# Altium footprint library PCB Modules.PcbLib: 23 footprints (part 1 of 2)
Each footprint in its own frame and in the unit in brackets; x right, y up, seen from the top. Pads: shape width x height; smd on the part's side, far side on the other; paste and mask are expansions set on the pad; w line width, h text height; cw(c..) or ccw(c..) is an arc to the next point about the centre after c.
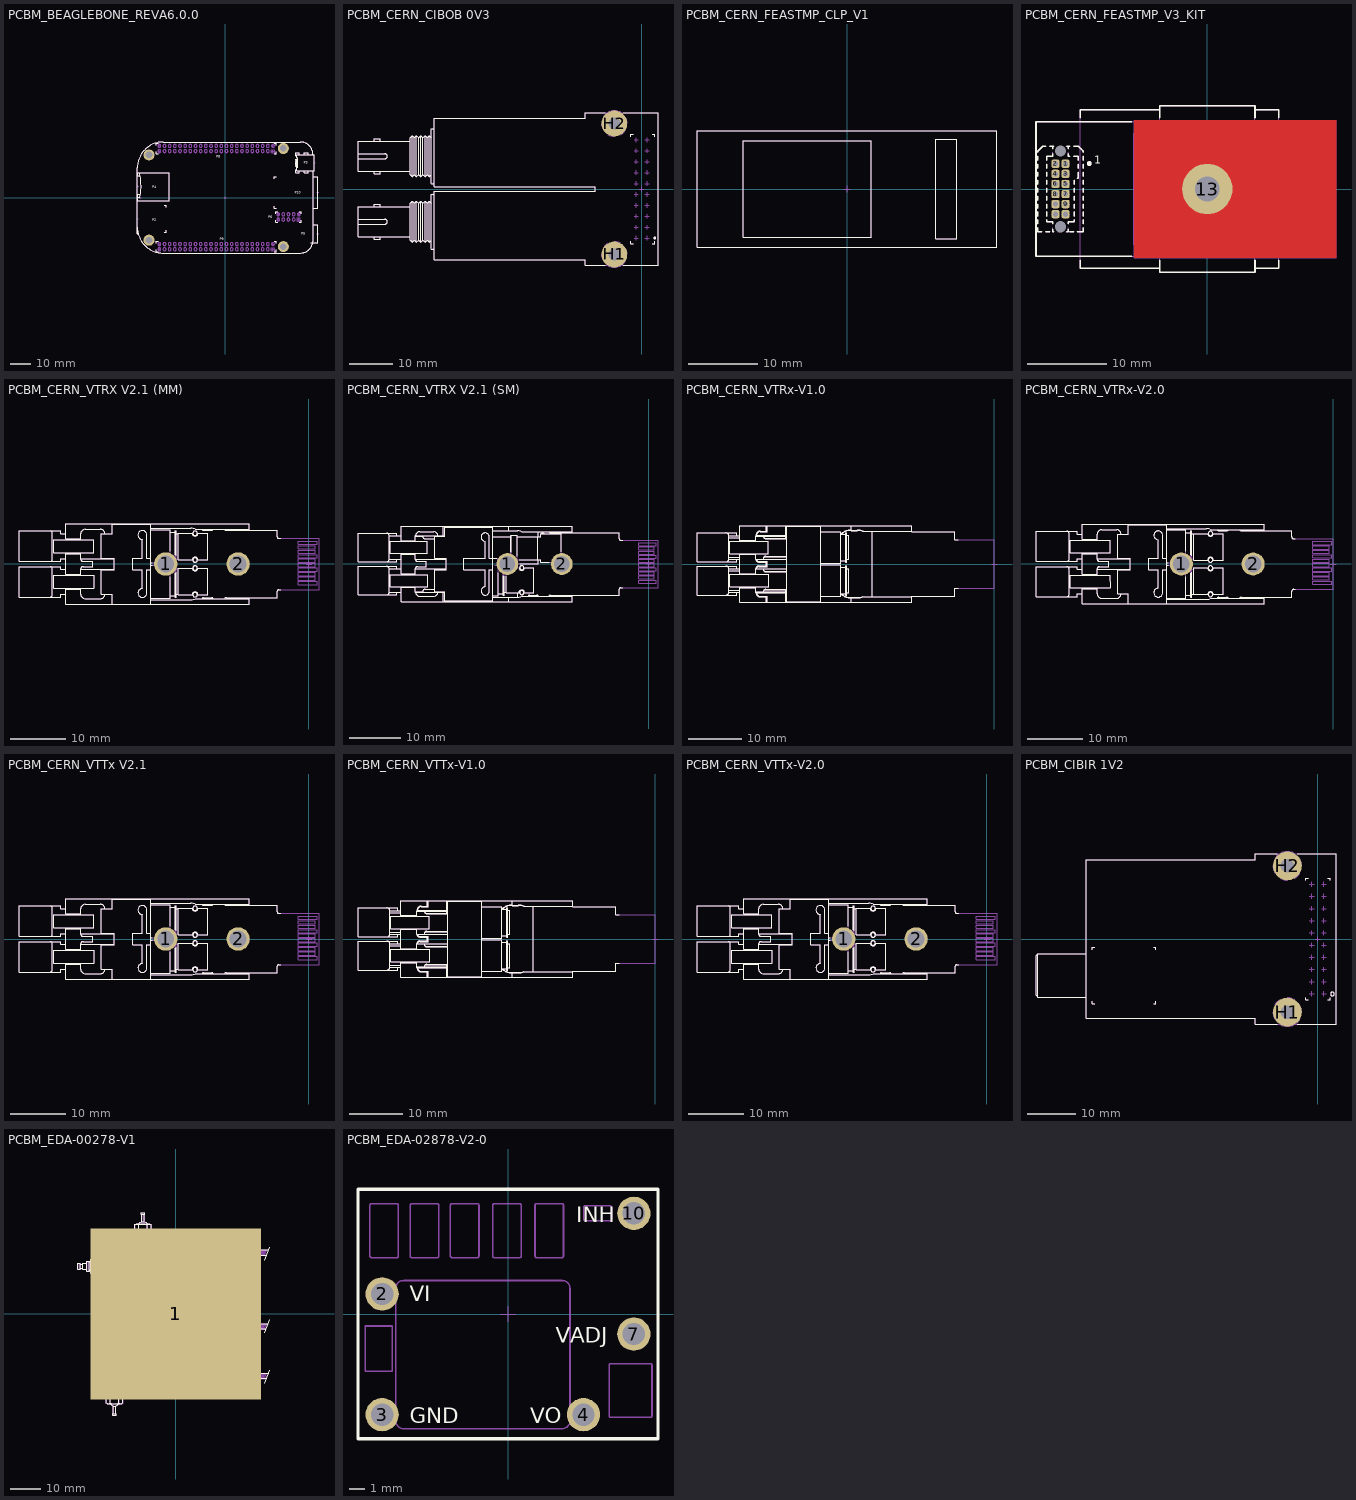
[diagram p0: the footprints below, top view; thin cyan lines are the x and y axes]

## PCBM_BEAGLEBONE_REVA6.0.0 [mm] "Beaglebone Development Module"
height 18.65
pads (4):
  round 5.4 hole 3.2: MEC1(-37.465,20.955) MEC2(-37.465,-20.955) MEC3(28.575,-24.13) MEC4(28.575,24.13)
Top Overlay:
  lines w0.2: -43.18,-3.22 -43.24,-3.22 -43.24,-17.72 -42.92,-17.72 -42.92,-17.16 ; -42.882,0.125 -41.99,0.125 ccw(c-41.99,0.225) -41.892,0.207 ccw(c-71.382,5.715) -41.932,11.433 -41.932,12.115 ; -41.812,10.775 -42.932,10.775 -42.932,12.115 -27.432,12.115 -27.432,-1.683 -42.932,-1.683 -42.932,1.675 -41.682,1.675 ; -33.905,-25.67 -33.905,-26.67 -32.905,-26.67 ; -33.905,-22.59 -33.905,-21.59 -32.905,-21.59 ; -33.905,22.59 -33.905,21.59 -32.905,21.59 ; -33.905,25.67 -33.905,26.67 -32.905,26.67 ; -30.08,-17.07 -29.08,-17.07 -29.08,-16.07 ; -30.08,-3.87 -29.08,-3.87 -29.08,-4.87 ; 24.015,-26.67 25.015,-26.67 25.015,-25.67 ; 24.015,-21.59 25.015,-21.59 25.015,-22.59 ; 24.015,21.59 25.015,21.59 25.015,22.59 ; 24.015,26.67 25.015,26.67 25.015,25.67 ; 24.175,-4.2 24.175,-5.2 25.175,-5.2 ; 24.175,9.28 24.175,10.28 25.175,10.28 ; 24.762,-11.065 24.762,-12.065 25.762,-12.065 ; 24.762,-7.985 24.762,-6.985 25.762,-6.985 ; 34.785,13.694 35.085,13.695 ; 34.785,13.695 34.785,12.195 36.285,12.195 36.285,13.295 ; 35.085,20.595 34.785,20.595 34.785,22.095 36.285,22.095 36.285,20.995 ; 35.785,15.37 34.785,15.37 34.785,15.72 35.785,15.72 ; 35.785,16.17 34.785,16.17 34.785,16.52 35.785,16.52 ; 35.785,16.97 34.785,16.97 34.785,17.32 35.785,17.32 ; 35.785,17.77 34.785,17.77 34.785,18.12 35.785,18.12 ; 35.785,18.57 34.785,18.57 34.785,18.92 35.785,18.92 ; 36.462,-12.065 37.462,-12.065 37.462,-11.065 ; 36.462,-6.985 37.462,-6.985 37.462,-7.985 ; 38.785,13.295 38.785,12.195 40.785,12.195 40.785,13.295 ; 38.785,20.995 38.785,22.095 40.785,22.095 40.785,20.995 ; 42.054,-22.28 45.554,-22.28 45.554,-13.28 43.18,-13.28 ; 43.174,20.955 ccw(c36.835,20.966) 36.836,27.305 -30.48,27.305 ccw(c-30.48,14.605) -43.18,14.605 -43.18,-14.605 ccw(c-30.48,-14.605) -30.48,-27.305 36.83,-27.305 ccw(c36.83,-20.955) 43.18,-20.955 43.18,13.295 ; 43.178,-5.2 45.515,-5.2 ; 43.18,10.28 45.515,10.28 ; 45.615,-5.1 45.615,10.18 ; 35.085,13.295 35.085,14.82 35.785,14.82 35.785,19.47 35.085,19.47 35.085,20.995 43.785,20.995 43.785,13.295 35.085,13.295
  text "P6" at 21.141,-10.071 h1.2
  text "P9" at -2.609,-20.996 h1.2
  text "P8" at -4.484,19.579 h1.2
  text "P4" at -35.963,4.663 h1.2
  text "P3" at 38.641,16.604 h1.2
  text "P2" at -35.784,-11.746 h1.2
  text "P10" at 34.166,1.929 h1.2
  text "P5" at 37.266,-18.196 h1.2
Mechanical 8:
  lines w0.1: -43.74,-10.47 -43.24,-10.47 ; -43.432,5.465 -42.932,5.465 ; -43.24,-10.97 -43.24,-10.47 ; -43.24,-9.97 -43.24,-10.47 ; -42.932,4.965 -42.932,5.465 ; -42.932,5.965 -42.932,5.465 ; -42.74,-10.47 -43.24,-10.47 ; -42.432,5.465 -42.932,5.465 ; -42.193,0 -41.693,0 ; -41.693,-0.5 -41.693,0 ; -41.693,0.5 -41.693,0 ; -41.193,0 -41.693,0 ; -37.965,-20.955 -37.465,-20.955 ; -37.965,20.955 -37.465,20.955 ; -37.465,-21.455 -37.465,-20.955 ; -37.465,-20.455 -37.465,-20.955 ; -37.465,20.455 -37.465,20.955 ; -37.465,21.455 -37.465,20.955 ; -36.965,-20.955 -37.465,-20.955 ; -36.965,20.955 -37.465,20.955 ; -32.885,-25.4 -32.385,-25.4 ; -32.885,-22.86 -32.385,-22.86 ; -32.885,22.86 -32.385,22.86 ; -32.885,25.4 -32.385,25.4 ; -32.385,-25.9 -32.385,-25.4 ; -32.385,-24.9 -32.385,-25.4 ; -32.385,-23.36 -32.385,-22.86 ; -32.385,-22.36 -32.385,-22.86 ; -32.385,22.36 -32.385,22.86 ; -32.385,23.36 -32.385,22.86 ; -32.385,24.9 -32.385,25.4 ; -32.385,25.9 -32.385,25.4 ; -31.885,-25.4 -32.385,-25.4 ; -31.885,-22.86 -32.385,-22.86 ; -31.885,22.86 -32.385,22.86 ; -31.885,25.4 -32.385,25.4 ; -0.5,0 0,0 ; 0,-0.5 0,0 ; 0,0.5 0,0 ; 0.5,0 0,0 ; 22.995,-25.4 23.495,-25.4 ; 22.995,-22.86 23.495,-22.86 ; 22.995,22.86 23.495,22.86 ; 22.995,25.4 23.495,25.4 ; 23.495,-25.9 23.495,-25.4 ; 23.495,-24.9 23.495,-25.4 ; 23.495,-23.36 23.495,-22.86 ; 23.495,-22.36 23.495,-22.86 ; 23.495,22.36 23.495,22.86 ; 23.495,23.36 23.495,22.86 ; 23.495,24.9 23.495,25.4 ; 23.495,25.9 23.495,25.4 ; 23.995,-25.4 23.495,-25.4 ; 23.995,-22.86 23.495,-22.86 ; 23.995,22.86 23.495,22.86 ; 23.995,25.4 23.495,25.4 ; 25.532,-10.795 26.032,-10.795 ; 25.532,-8.255 26.032,-8.255 ; 26.032,-11.295 26.032,-10.795 ; 26.032,-10.295 26.032,-10.795 ; 26.032,-8.755 26.032,-8.255 ; 26.032,-7.755 26.032,-8.255 ; 26.532,-10.795 26.032,-10.795 ; 26.532,-8.255 26.032,-8.255 ; 28.075,-24.13 28.575,-24.13 ; 28.075,24.13 28.575,24.13 ; 28.575,-24.63 28.575,-24.13 ; 28.575,-23.63 28.575,-24.13 ; 28.575,23.63 28.575,24.13 ; 28.575,24.63 28.575,24.13 ; 29.075,-24.13 28.575,-24.13 ; 29.075,24.13 28.575,24.13 ; 35.692,-10.795 36.192,-10.795 ; 35.692,-8.255 36.192,-8.255 ; 36.192,-11.295 36.192,-10.795 ; 36.192,-10.295 36.192,-10.795 ; 36.192,-8.755 36.192,-8.255 ; 36.192,-7.755 36.192,-8.255 ; 36.692,-10.795 36.192,-10.795 ; 36.692,-8.255 36.192,-8.255 ; 43.285,17.145 43.785,17.145 ; 43.785,16.645 43.785,17.145 ; 43.785,17.645 43.785,17.145 ; 44.285,17.145 43.785,17.145 ; 45.054,-17.78 45.554,-17.78 ; 45.115,2.54 45.615,2.54 ; 45.554,-18.28 45.554,-17.78 ; 45.554,-17.28 45.554,-17.78 ; 45.615,2.04 45.615,2.54 ; 45.615,3.04 45.615,2.54 ; 46.054,-17.78 45.554,-17.78 ; 46.115,2.54 45.615,2.54
Mechanical 14:
  drawing of 213 lines, arcs and shapes, not listed
  text "P6" at 21.141,-10.071 h1.2
  text "P9" at -2.609,-20.996 h1.2
  text "P8" at -4.484,19.579 h1.2
  text "P4" at -35.963,4.663 h1.2
  text "P3" at 38.641,16.604 h1.2
  text "P2" at -35.784,-11.746 h1.2
  text "P10" at 34.166,1.929 h1.2
  text "P5" at 37.266,-18.196 h1.2
3D body "PCBM_BEAGLEBONE_REVA6.0.0.stp": height 20.79, standoff 2.14, extent -43.24,-27.305 45.615,27.305

## PCBM_CERN_CIBOB 0V3 [mm] "Controls Interlocks Beam Optical B (CIBOB) 0V3 Printed Circuit Boar Module"
height 13.9
pads (2):
  round 6 hole 2.8: H1(-6.35,-15.24) H2(-6.35,15.24)
Top Overlay:
  circle w0.3: c3.05,-11.4 r0.15
  lines w0.2: -65.995,-8.22 -59.795,-8.22 ccw(c-59.795,-7.62) -59.795,-7.02 -65.995,-7.02 ; -65.995,7.02 -59.795,7.02 ccw(c-59.795,7.62) -59.795,8.22 -65.995,8.22 ; -62.195,-11.145 -62.195,-11.72 -60.795,-11.72 -60.795,-11.145 ; -62.195,-4.095 -62.195,-3.52 -60.795,-3.52 -60.795,-4.095 ; -62.195,4.095 -62.195,3.52 -60.795,3.52 -60.795,4.095 ; -62.195,11.145 -62.195,11.72 -60.795,11.72 -60.795,11.145 ; -53.895,-11.145 -65.995,-11.145 ; -53.895,-4.095 -65.995,-4.095 ; -53.895,4.095 -65.995,4.095 ; -53.895,11.145 -65.995,11.145 ; -48.895,-11.87 -49.395,-12.37 ; -48.895,-3.37 -49.395,-2.87 ; -48.895,3.37 -49.395,2.87 ; -48.895,11.87 -49.395,12.37 ; -48.26,-13.97 -48.895,-13.97 -48.895,-1.27 -48.26,-1.27 ; -48.26,1.27 -48.895,1.27 -48.895,13.97 -48.26,13.97 ; -8.482,17.78 -13.06,17.78 -13.06,16.48 -48.26,16.48 -48.26,0.5 -10.76,0.5 -10.76,-0.5 -48.26,-0.5 -48.26,-16.48 -13.06,-16.48 -13.06,-17.78 -8.457,-17.78 ; -4.268,17.78 3.81,17.78 3.81,-17.78 -4.243,-17.78 ; -2.5,-12.2 -2.5,-12.7 -2,-12.7 ; -2.5,12.2 -2.5,12.7 -2,12.7 ; 2.5,-12.7 3,-12.7 3,-12.2 ; -65.995,-11.145 -65.995,-4.095 ; -65.995,-11.145 -65.995,-4.095 ; -65.995,4.095 -65.995,11.145 ; -65.995,4.095 -65.995,11.145 ; -53.395,-12.37 -52.895,-11.87 ; -53.395,-12.37 -53.895,-11.87 -53.895,-3.37 -53.395,-2.87 ; -53.395,-12.37 -53.395,-2.87 ; -53.395,-2.87 -52.895,-3.37 ; -53.395,2.87 -52.895,3.37 ; -53.395,2.87 -53.895,3.37 -53.895,11.87 -53.395,12.37 ; -53.395,2.87 -53.395,12.37 ; -53.395,12.37 -52.895,11.87 ; -52.895,-11.87 -52.395,-12.37 ; -52.895,-11.87 -52.895,-3.37 ; -52.895,-3.37 -52.395,-2.87 ; -52.895,3.37 -52.395,2.87 ; -52.895,3.37 -52.895,11.87 ; -52.895,11.87 -52.395,12.37 ; -52.395,-12.37 -51.895,-11.87 ; -52.395,-12.37 -52.395,-2.87 ; -52.395,-2.87 -51.895,-3.37 ; -52.395,2.87 -51.895,3.37 ; -52.395,2.87 -52.395,12.37 ; -52.395,12.37 -51.895,11.87 ; -51.895,-11.87 -51.395,-12.37 ; -51.895,-11.87 -51.895,-3.37 ; -51.895,-3.37 -51.395,-2.87 ; -51.895,3.37 -51.395,2.87 ; -51.895,3.37 -51.895,11.87 ; -51.895,11.87 -51.395,12.37 ; -51.395,-12.37 -50.895,-11.87 ; -51.395,-12.37 -51.395,-2.87 ; -51.395,-2.87 -50.895,-3.37 ; -51.395,2.87 -50.895,3.37 ; -51.395,2.87 -51.395,12.37 ; -51.395,12.37 -50.895,11.87 ; -50.895,-11.87 -50.395,-12.37 ; -50.895,-11.87 -50.895,-3.37 ; -50.895,-3.37 -50.395,-2.87 ; -50.895,3.37 -50.395,2.87 ; -50.895,3.37 -50.895,11.87 ; -50.895,11.87 -50.395,12.37 ; -50.395,-12.37 -49.895,-11.87 ; -50.395,-12.37 -50.395,-2.87 ; -50.395,-2.87 -49.895,-3.37 ; -50.395,2.87 -49.895,3.37 ; -50.395,2.87 -50.395,12.37 ; -50.395,12.37 -49.895,11.87 ; -49.895,-11.87 -49.395,-12.37 ; -49.895,-11.87 -49.895,-3.37 ; -49.895,-3.37 -49.395,-2.87 ; -49.895,3.37 -49.395,2.87 ; -49.895,3.37 -49.895,11.87 ; -49.895,11.87 -49.395,12.37 ; -49.395,-12.37 -49.395,-2.87 ; -49.395,2.87 -49.395,12.37 ; 3,12.7 3,12.2 3,12.7 ; 3,12.7 2.5,12.7 3,12.7
Mechanical 8:
  lines w0.1: -6.85,-15.24 -6.35,-15.24 ; -6.85,15.24 -6.35,15.24 ; -6.35,-15.74 -6.35,-15.24 ; -6.35,-14.74 -6.35,-15.24 ; -6.35,14.74 -6.35,15.24 ; -6.35,15.74 -6.35,15.24 ; -5.85,-15.24 -6.35,-15.24 ; -5.85,15.24 -6.35,15.24 ; -1.77,-11.43 -1.27,-11.43 ; -1.77,-8.89 -1.27,-8.89 ; -1.77,-6.35 -1.27,-6.35 ; -1.77,-3.81 -1.27,-3.81 ; -1.77,-1.27 -1.27,-1.27 ; -1.77,1.27 -1.27,1.27 ; -1.77,3.81 -1.27,3.81 ; -1.77,6.35 -1.27,6.35 ; -1.77,8.89 -1.27,8.89 ; -1.77,11.43 -1.27,11.43 ; -1.27,-11.93 -1.27,-11.43 ; -1.27,-10.93 -1.27,-11.43 ; -1.27,-9.39 -1.27,-8.89 ; -1.27,-8.39 -1.27,-8.89 ; -1.27,-6.85 -1.27,-6.35 ; -1.27,-5.85 -1.27,-6.35 ; -1.27,-4.31 -1.27,-3.81 ; -1.27,-3.31 -1.27,-3.81 ; -1.27,-1.77 -1.27,-1.27 ; -1.27,-0.77 -1.27,-1.27 ; -1.27,0.77 -1.27,1.27 ; -1.27,1.77 -1.27,1.27 ; -1.27,3.31 -1.27,3.81 ; -1.27,4.31 -1.27,3.81 ; -1.27,5.85 -1.27,6.35 ; -1.27,6.85 -1.27,6.35 ; -1.27,8.39 -1.27,8.89 ; -1.27,9.39 -1.27,8.89 ; -1.27,10.93 -1.27,11.43 ; -1.27,11.93 -1.27,11.43 ; -0.77,-11.43 -1.27,-11.43 ; -0.77,-8.89 -1.27,-8.89 ; -0.77,-6.35 -1.27,-6.35 ; -0.77,-3.81 -1.27,-3.81 ; -0.77,-1.27 -1.27,-1.27 ; -0.77,1.27 -1.27,1.27 ; -0.77,3.81 -1.27,3.81 ; -0.77,6.35 -1.27,6.35 ; -0.77,8.89 -1.27,8.89 ; -0.77,11.43 -1.27,11.43 ; -0.5,0 0,0 ; 0,-0.5 0,0 ; 0,0.5 0,0 ; 0.5,0 0,0 ; 0.77,-11.43 1.27,-11.43 ; 0.77,-8.89 1.27,-8.89 ; 0.77,-6.35 1.27,-6.35 ; 0.77,-3.81 1.27,-3.81 ; 0.77,-1.27 1.27,-1.27 ; 0.77,1.27 1.27,1.27 ; 0.77,3.81 1.27,3.81 ; 0.77,6.35 1.27,6.35 ; 0.77,8.89 1.27,8.89 ; 1.27,-11.93 1.27,-11.43 ; 1.27,-10.93 1.27,-11.43 ; 1.27,-9.39 1.27,-8.89 ; 1.27,-8.39 1.27,-8.89 ; 1.27,-6.85 1.27,-6.35 ; 1.27,-5.85 1.27,-6.35 ; 1.27,-4.31 1.27,-3.81 ; 1.27,-3.31 1.27,-3.81 ; 1.27,-1.77 1.27,-1.27 ; 1.27,-0.77 1.27,-1.27 ; 1.27,0.77 1.27,1.27 ; 1.27,1.77 1.27,1.27 ; 1.27,3.31 1.27,3.81 ; 1.27,4.31 1.27,3.81 ; 1.27,5.85 1.27,6.35 ; 1.27,6.85 1.27,6.35 ; 1.27,8.39 1.27,8.89 ; 1.27,9.39 1.27,8.89 ; 1.77,-11.43 1.27,-11.43 ; 1.77,-8.89 1.27,-8.89 ; 1.77,-6.35 1.27,-6.35 ; 1.77,-3.81 1.27,-3.81 ; 1.77,-1.27 1.27,-1.27 ; 1.77,1.27 1.27,1.27 ; 1.77,3.81 1.27,3.81 ; 1.77,6.35 1.27,6.35 ; 1.77,8.89 1.27,8.89 ; 1.27,11.43 1.27,10.93 1.27,11.43 ; 1.27,11.43 1.77,11.43 1.27,11.43 ; 1.27,11.43 1.27,11.93 1.27,11.43 ; 1.27,11.43 0.77,11.43 1.27,11.43
Mechanical 14:
  circle w0.3: c3.05,-11.4 r0.15
  circle w0.1: c-6.35,-15.24 r1.35
  circle w0.1: c-6.35,15.24 r1.35
  lines w0.1: -65.995,-8.22 -59.795,-8.22 ccw(c-59.795,-7.62) -59.795,-7.02 -65.995,-7.02 ; -65.995,7.02 -59.795,7.02 ccw(c-59.795,7.62) -59.795,8.22 -65.995,8.22 ; -62.195,-11.145 -62.195,-11.72 -60.795,-11.72 -60.795,-11.145 ; -62.195,-4.095 -62.195,-3.52 -60.795,-3.52 -60.795,-4.095 ; -62.195,4.095 -62.195,3.52 -60.795,3.52 -60.795,4.095 ; -62.195,11.145 -62.195,11.72 -60.795,11.72 -60.795,11.145 ; -53.895,-11.145 -65.995,-11.145 -65.995,-4.095 -53.895,-4.095 ; -53.895,4.095 -65.995,4.095 -65.995,11.145 -53.895,11.145 ; -48.895,-13.77 -48.895,-1.47 ; -48.895,-11.87 -49.395,-12.37 ; -48.895,-3.37 -49.395,-2.87 ; -48.895,1.47 -48.895,13.77 ; -48.895,3.37 -49.395,2.87 ; -48.895,11.87 -49.395,12.37 ; -48.495,-13.77 cw(c-48.695,-13.77) -48.695,-13.97 -48.26,-13.97 ; -48.495,-1.47 ccw(c-48.695,-1.47) -48.695,-1.27 -48.26,-1.27 ; -48.495,1.47 cw(c-48.695,1.47) -48.695,1.27 -48.26,1.27 ; -48.495,13.77 ccw(c-48.695,13.77) -48.695,13.97 -48.26,13.97 ; -9.35,-15.24 ccw(c-6.35,-15.24) -8.948,-16.74 ; -9.35,15.24 ccw(c-6.35,15.24) -8.948,13.74 ; -8.948,-13.74 cw(c-6.35,-15.24) -7.85,-12.642 ; -8.948,16.74 cw(c-6.35,15.24) -7.946,17.78 cw(c-6.35,15.24) -4.754,17.78 ; -7.946,-17.78 ccw(c-6.35,-15.24) -4.754,-17.78 ccw(c-6.35,-15.24) -3.752,-16.74 ; -7.85,12.642 ccw(c-6.35,15.24) -6.35,12.24 ; -6.35,-12.24 cw(c-6.35,-15.24) -4.85,-12.642 ; -4.85,12.642 ccw(c-6.35,15.24) -3.752,13.74 ; -3.752,-13.74 cw(c-6.35,-15.24) -3.35,-15.24 ; -3.752,16.74 cw(c-6.35,15.24) -3.35,15.24 ; -2.5,-12.2 -2.5,-12.7 -2,-12.7 ; -2.5,12.2 -2.5,12.7 -2,12.7 ; 2.5,-12.7 3,-12.7 3,-12.2 ; -53.395,-12.37 -52.895,-11.87 ; -53.395,-12.37 -53.895,-11.87 -53.895,-3.37 -53.395,-2.87 ; -53.395,-12.37 -53.395,-2.87 ; -53.395,-2.87 -52.895,-3.37 ; -53.395,2.87 -52.895,3.37 ; -53.395,2.87 -53.895,3.37 -53.895,11.87 -53.395,12.37 ; -53.395,2.87 -53.395,12.37 ; -53.395,12.37 -52.895,11.87 ; -52.895,-11.87 -52.395,-12.37 ; -52.895,-11.87 -52.895,-3.37 ; -52.895,-3.37 -52.395,-2.87 ; -52.895,3.37 -52.395,2.87 ; -52.895,3.37 -52.895,11.87 ; -52.895,11.87 -52.395,12.37 ; -52.395,-12.37 -51.895,-11.87 ; -52.395,-12.37 -52.395,-2.87 ; -52.395,-2.87 -51.895,-3.37 ; -52.395,2.87 -51.895,3.37 ; -52.395,2.87 -52.395,12.37 ; -52.395,12.37 -51.895,11.87 ; -51.895,-11.87 -51.395,-12.37 ; -51.895,-11.87 -51.895,-3.37 ; -51.895,-3.37 -51.395,-2.87 ; -51.895,3.37 -51.395,2.87 ; -51.895,3.37 -51.895,11.87 ; -51.895,11.87 -51.395,12.37 ; -51.395,-12.37 -50.895,-11.87 ; -51.395,-12.37 -51.395,-2.87 ; -51.395,-2.87 -50.895,-3.37 ; -51.395,2.87 -50.895,3.37 ; -51.395,2.87 -51.395,12.37 ; -51.395,12.37 -50.895,11.87 ; -50.895,-11.87 -50.395,-12.37 ; -50.895,-11.87 -50.895,-3.37 ; -50.895,-3.37 -50.395,-2.87 ; -50.895,3.37 -50.395,2.87 ; -50.895,3.37 -50.895,11.87 ; -50.895,11.87 -50.395,12.37 ; -50.395,-12.37 -49.895,-11.87 ; -50.395,-12.37 -50.395,-2.87 ; -50.395,-2.87 -49.895,-3.37 ; -50.395,2.87 -49.895,3.37 ; -50.395,2.87 -50.395,12.37 ; -50.395,12.37 -49.895,11.87 ; -49.895,-11.87 -49.395,-12.37 ; -49.895,-11.87 -49.895,-3.37 ; -49.895,-3.37 -49.395,-2.87 ; -49.895,3.37 -49.395,2.87 ; -49.895,3.37 -49.895,11.87 ; -49.895,11.87 -49.395,12.37 ; -49.395,-12.37 -49.395,-2.87 ; -49.395,2.87 -49.395,12.37 ; 3,12.7 3,12.2 3,12.7 ; 3,12.7 2.5,12.7 3,12.7 ; -48.26,-16.48 -13.06,-16.48 -13.06,-17.78 3.81,-17.78 3.81,17.78 -13.06,17.78 -13.06,16.48 -48.26,16.48 -48.26,0.5 -10.76,0.5 -10.76,-0.5 -48.26,-0.5 -48.26,-16.48
3D body "CERN_PCBM_CIBO 0V3.stp": height 13.9, standoff -3.2, extent -65.995,-18.24 3.81,18.24

## PCBM_CERN_FEASTMP_CLP_V1 [mm] "Radiation And Magnetic Field Tolerant 10W DC/DC Converter Module"
height 8.4
Top Overlay:
  lines w0.1: -21.74,-8.47 -21.74,8.47 21.74,8.47 21.74,-8.47 -21.74,-8.47 ; -15.01,-7.01 -15.01,6.99 3.49,6.99 3.49,-7.01 -15.01,-7.01 ; 12.841,-7.201 15.889,-7.201 15.889,7.201 12.841,7.201 12.841,-7.201
Mechanical 8:
  lines w0.1: -0.5,0 0,0 ; 0,-0.5 0,0 ; 0,0.5 0,0 ; 0.5,0 0,0
Mechanical 14:
  lines w0.1: -21.74,-8.47 -21.74,8.47 21.74,8.47 21.74,-8.47 -21.74,-8.47 ; -15.01,-7.01 -15.01,6.99 3.49,6.99 3.49,-7.01 -15.01,-7.01 ; 12.841,-7.201 15.889,-7.201 15.889,7.201 12.841,7.201 12.841,-7.201
3D body "PCBM_CERN_FEASTMP_CLP_V1.stp": height 8, standoff -0.4, extent -21.74,-8.47 21.74,8.47

## PCBM_CERN_FEASTMP_V3_KIT [mm] "Full Kit of Radiation and Magnetic Field Tolerant 10W DC/DC Converter Module"
height 17
pads (15):
  rrect50% 1.05x1.05 hole 0.65: 1(-17.843,3.178) 2(-19.113,3.178) 3(-17.843,1.908) 4(-19.113,1.908) 5(-17.843,0.638) 6(-19.113,0.638) 7(-17.843,-0.632) 8(-19.113,-0.632) 9(-17.843,-1.902) 10(-19.113,-1.902) 11(-17.843,-3.172) 12(-19.113,-3.172)
  round 6.35 hole 3.1: 13(0,0)
  round 0.5 hole 1.4 unplated mask+0.45: MECH1(-18.478,-4.759) MECH2(-18.478,4.766)
Top Layer:
  region: -9.2,-8.668 16.2,-8.668 16.2,8.668 -9.2,8.668
Top Overlay:
  circle w0.3: c-14.85,3.2 r0.15
  lines w0.2: -21.339,-4.897 -21.339,-5.397 -20.839,-5.397 ; -21.339,-4.397 -21.339,-3.897 ; -21.339,-3.397 -21.339,-2.897 ; -21.339,-2.397 -21.339,-1.897 ; -21.339,-1.397 -21.339,-0.897 ; -21.339,-0.397 -21.339,0.103 ; -21.339,0.603 -21.339,1.103 ; -21.339,1.603 -21.339,2.103 ; -21.339,2.603 -21.339,3.103 ; -21.339,3.603 -21.339,4.103 ; -21.339,4.603 -21.339,4.763 -20.704,5.398 -20.339,5.398 ; -20.339,-5.397 -19.839,-5.397 ; -20.196,-3.897 -20.196,-4.127 -19.434,-4.127 -19.434,-4.397 ; -20.196,-3.397 -20.196,-2.897 ; -20.196,-2.397 -20.196,-1.897 ; -20.196,-1.397 -20.196,-0.897 ; -20.196,-0.397 -20.196,0.103 ; -20.196,0.603 -20.196,1.103 ; -20.196,1.603 -20.196,2.103 ; -20.196,2.603 -20.196,3.103 ; -20.196,3.603 -20.196,4.128 -19.434,4.128 -19.434,4.461 ; -19.839,5.398 -19.339,5.398 -19.434,5.398 -19.434,5.103 ; -19.434,-5.069 -19.434,-5.397 -19.339,-5.397 ; -17.707,-5.397 -17.529,-5.397 -17.529,-5.069 ; -17.529,-4.397 -17.529,-4.127 -16.767,-4.127 -16.767,-3.897 ; -17.529,4.461 -17.529,4.128 -17.339,4.128 ; -17.529,5.103 -17.529,5.398 -17.707,5.398 -17.339,5.398 ; -17.339,-5.397 -16.839,-5.397 ; -16.839,4.128 -16.259,4.128 -16.259,3.603 ; -16.839,5.398 -16.259,5.398 -15.964,5.103 ; -16.767,-3.397 -16.767,-2.897 ; -16.767,-2.397 -16.767,-1.897 ; -16.767,-1.397 -16.767,-0.897 ; -16.767,-0.397 -16.767,0.103 ; -16.767,0.603 -16.767,1.103 ; -16.339,-5.397 -15.624,-5.397 -15.624,-4.897 ; -16.339,1.334 -16.259,1.334 -16.259,2.103 ; -16.259,2.603 -16.259,3.103 ; -16,-8.968 -16,-10 -6,-10 ; -16,8.968 -16,10 -6,10 ; -15.839,4.978 -15.624,4.763 -15.624,4.603 ; -15.624,-4.397 -15.624,-3.897 ; -15.624,-3.397 -15.624,-2.897 ; -15.624,-2.397 -15.624,-1.897 ; -15.624,-1.397 -15.624,-0.897 ; -15.624,-0.397 -15.624,0.103 ; -15.624,0.603 -15.624,1.103 ; -15.624,1.603 -15.624,2.103 ; -15.624,2.603 -15.624,3.103 ; -15.624,3.603 -15.624,4.103 ; -9.5,-8.468 -21.567,-8.468 -21.567,8.468 -9.5,8.468 ; -6,-8.968 -6,-10.5 6,-10.5 6,-8.968 ; -6,8.968 -6,10.5 6,10.5 6,8.968 ; 6,-10 9,-10 9,-8.968 ; 6,10 9,10 9,8.968
  text "1" at -14.247,3.196 h1
Mechanical 8:
  circle w0.1: c0,0 r3.175
  lines w0.1: -19.613,-3.172 -19.113,-3.172 ; -19.613,-1.902 -19.113,-1.902 ; -19.613,-0.632 -19.113,-0.632 ; -19.613,0.638 -19.113,0.638 ; -19.613,1.908 -19.113,1.908 ; -19.613,3.178 -19.113,3.178 ; -19.113,-3.672 -19.113,-3.172 ; -19.113,-2.672 -19.113,-3.172 ; -19.113,-2.402 -19.113,-1.902 ; -19.113,-1.402 -19.113,-1.902 ; -19.113,-1.132 -19.113,-0.632 ; -19.113,-0.132 -19.113,-0.632 ; -19.113,0.138 -19.113,0.638 ; -19.113,1.138 -19.113,0.638 ; -19.113,1.408 -19.113,1.908 ; -19.113,2.408 -19.113,1.908 ; -19.113,2.678 -19.113,3.178 ; -19.113,3.678 -19.113,3.178 ; -18.982,-4.764 -18.482,-4.764 ; -18.982,4.766 -18.482,4.766 ; -18.613,-3.172 -19.113,-3.172 ; -18.613,-1.902 -19.113,-1.902 ; -18.613,-0.632 -19.113,-0.632 ; -18.613,0.638 -19.113,0.638 ; -18.613,1.908 -19.113,1.908 ; -18.613,3.178 -19.113,3.178 ; -18.482,-5.264 -18.482,-4.764 ; -18.482,-4.264 -18.482,-4.764 ; -18.482,4.266 -18.482,4.766 ; -18.482,5.266 -18.482,4.766 ; -18.343,-3.172 -17.843,-3.172 ; -18.343,-1.902 -17.843,-1.902 ; -18.343,-0.632 -17.843,-0.632 ; -18.343,0.638 -17.843,0.638 ; -18.343,1.908 -17.843,1.908 ; -18.343,3.178 -17.843,3.178 ; -17.982,-4.764 -18.482,-4.764 ; -17.982,4.766 -18.482,4.766 ; -17.843,-3.672 -17.843,-3.172 ; -17.843,-2.672 -17.843,-3.172 ; -17.843,-2.402 -17.843,-1.902 ; -17.843,-1.402 -17.843,-1.902 ; -17.843,-1.132 -17.843,-0.632 ; -17.843,-0.132 -17.843,-0.632 ; -17.843,0.138 -17.843,0.638 ; -17.843,1.138 -17.843,0.638 ; -17.843,1.408 -17.843,1.908 ; -17.843,2.408 -17.843,1.908 ; -17.843,2.678 -17.843,3.178 ; -17.843,3.678 -17.843,3.178 ; -17.343,-3.172 -17.843,-3.172 ; -17.343,-1.902 -17.843,-1.902 ; -17.343,-0.632 -17.843,-0.632 ; -17.343,0.638 -17.843,0.638 ; -17.343,1.908 -17.843,1.908 ; -17.343,3.178 -17.843,3.178 ; -0.5,0 0,0 ; 0,-0.5 0,0 ; 0,0.5 0,0 ; 0.5,0 0,0 ; 3,0 3.5,0 ; 3.5,-0.5 3.5,0 ; 3.5,0.5 3.5,0 ; 4,0 3.5,0 ; 12.001,-4.696 12.501,-4.696 ; 12.001,4.702 12.501,4.702 ; 12.501,-5.196 12.501,-4.696 ; 12.501,-4.196 12.501,-4.696 ; 12.501,4.202 12.501,4.702 ; 12.501,5.202 12.501,4.702 ; 13.001,-4.696 12.501,-4.696 ; 13.001,4.702 12.501,4.702 ; -9.2,-8.668 16.2,-8.668 16.2,8.668 -9.2,8.668 -9.2,-8.668
Mechanical 14:
  circle w0.3: c-14.85,3.2 r0.15
  circle w0.1: c12.501,4.702 r1.079
  circle w0.1: c12.501,-4.696 r1.079
  lines w0.1: -21.339,-4.897 -21.339,-5.397 -20.839,-5.397 ; -21.339,-4.397 -21.339,-3.897 ; -21.339,-3.397 -21.339,-2.897 ; -21.339,-2.397 -21.339,-1.897 ; -21.339,-1.397 -21.339,-0.897 ; -21.339,-0.397 -21.339,0.103 ; -21.339,0.603 -21.339,1.103 ; -21.339,1.603 -21.339,2.103 ; -21.339,2.603 -21.339,3.103 ; -21.339,3.603 -21.339,4.103 ; -21.339,4.603 -21.339,4.763 -20.704,5.398 -20.339,5.398 ; -20.339,-5.397 -19.839,-5.397 ; -20.196,-3.897 -20.196,-4.127 -19.434,-4.127 -19.434,-4.397 ; -20.196,-3.397 -20.196,-2.897 ; -20.196,-2.397 -20.196,-1.897 ; -20.196,-1.397 -20.196,-0.897 ; -20.196,-0.397 -20.196,0.103 ; -20.196,0.603 -20.196,1.103 ; -20.196,1.603 -20.196,2.103 ; -20.196,2.603 -20.196,3.103 ; -20.196,3.603 -20.196,4.128 -19.434,4.128 -19.434,4.603 ; -19.839,5.398 -19.339,5.398 -19.434,5.398 -19.434,5.103 ; -19.434,-4.897 -19.434,-5.397 -19.339,-5.397 ; -18.839,-5.397 -18.339,-5.397 ; -17.839,-5.397 -17.529,-5.397 -17.529,-4.897 ; -17.529,-4.397 -17.529,-4.127 -16.767,-4.127 -16.767,-3.897 ; -17.529,4.603 -17.529,4.128 -17.339,4.128 ; -17.529,5.103 -17.529,5.398 -17.839,5.398 -17.339,5.398 ; -17.339,-5.397 -16.839,-5.397 ; -16.839,4.128 -16.259,4.128 -16.259,3.603 ; -16.839,5.398 -16.259,5.398 -15.964,5.103 ; -16.767,-3.397 -16.767,-2.897 ; -16.767,-2.397 -16.767,-1.897 ; -16.767,-1.397 -16.767,-0.897 ; -16.767,-0.397 -16.767,0.103 ; -16.767,0.603 -16.767,1.103 ; -16.339,-5.397 -15.624,-5.397 -15.624,-4.897 ; -16.339,1.334 -16.259,1.334 -16.259,2.103 ; -16.259,2.603 -16.259,3.103 ; -15.839,4.978 -15.624,4.763 -15.624,4.603 ; -15.624,-4.397 -15.624,-3.897 ; -15.624,-3.397 -15.624,-2.897 ; -15.624,-2.397 -15.624,-1.897 ; -15.624,-1.397 -15.624,-0.897 ; -15.624,-0.397 -15.624,0.103 ; -15.624,0.603 -15.624,1.103 ; -15.624,1.603 -15.624,2.103 ; -15.624,2.603 -15.624,3.103 ; -15.624,3.603 -15.624,4.103 ; -6,-10 -16,-10 -16,10 -6,10 ; -6,-8.468 -21.567,-8.468 -21.567,8.468 -6,8.468 ; -6,-6.997 -9.236,-6.997 -9.236,7.003 -6,7.003 ; 6,-10 9,-10 9,-8.468 ; 6,-8.468 16,-8.468 16,8.468 6,8.468 ; 6,-6.997 9.264,-6.997 9.264,7.003 6,7.003 ; 6,10 9,10 9,8.468 ; -18.839,5.398 -18.339,5.398 -18.839,5.398 ; -6,-10.5 6,-10.5 6,10.5 -6,10.5 -6,-10.5